# Altium footprint library _components.PcbLib: 53 footprints (part 1 of 4)
Each footprint in its own frame and in the unit in brackets; x right, y up, seen from the top. Pads: shape width x height; smd on the part's side, far side on the other; paste and mask are expansions set on the pad; w line width, h text height; cw(c..) or ccw(c..) is an arc to the next point about the centre after c.
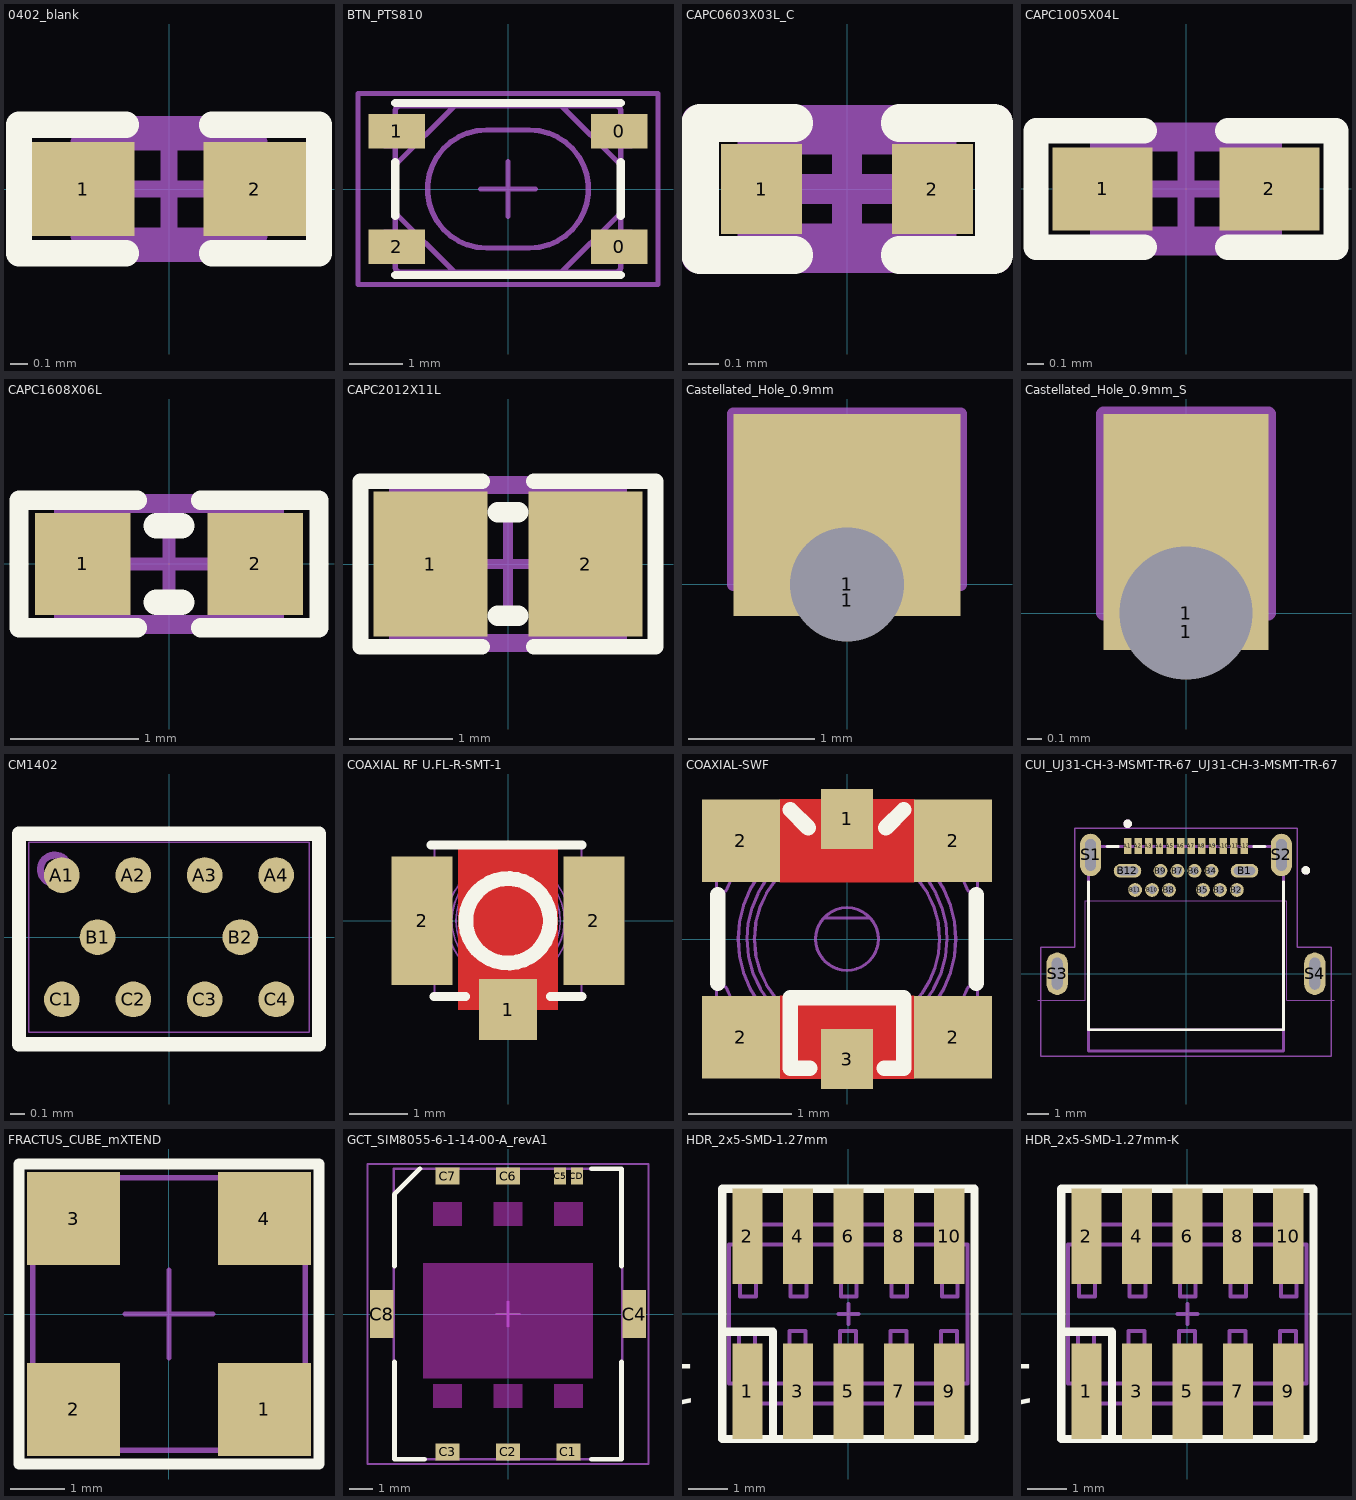
[diagram p0: the footprints below, top view; thin cyan lines are the x and y axes]

## 0402_blank [mm] "Blank footprint"
pads (2):
  rect 0.6x0.55 smd: 1(-0.5,0) 2(0.5,0)
Top Overlay:
  lines w0.152: -0.25,-0.375 -0.875,-0.375 -0.875,0.375 -0.25,0.375 ; 0.25,-0.375 0.875,-0.375 0.875,0.375 0.25,0.375
Top Assembly Info:
  lines w0.1: -0.525,-0.275 -0.525,0.275 0.525,0.275 0.525,-0.275 -0.525,-0.275
  text ".Designator" at -0.432,-0.152 h0.3
Top Placement:
  lines w0.1: -0.275,0 0.275,0 ; 0,-0.275 0,0.275 ; -0.875,-0.375 0.875,-0.375 0.875,0.375 -0.875,0.375 -0.875,-0.375

## BTN_PTS810 [mm]
height 2.5
pads (4):
  rect 1.05x0.65 smd: 0(2.075,-1.075) 0(2.075,1.075) 1(-2.075,1.075) 2(-2.075,-1.075)
Top Overlay:
  lines w0.15: -2.1,-1.6 2.1,-1.6 ; -2.1,-0.5 -2.1,0.5 ; -2.1,1.6 2.1,1.6 ; 2.1,-0.5 2.1,0.5
Top Assembly Info:
  lines w0.1: -2.1,-1.35 -2.3,-1.35 -2.3,-0.8 -2.1,-0.8 ; -2.1,-0.45 -1,-1.55 ; -2.1,0.45 -1,1.55 ; -2.1,0.8 -2.3,0.8 -2.3,1.35 -2.1,1.35 ; 1,-1.55 2.1,-0.45 ; 1,1.55 2.1,0.45 ; 2.1,-1.35 2.3,-1.35 2.3,-0.8 2.1,-0.8 ; 2.1,0.8 2.3,0.8 2.3,1.35 2.1,1.35 ; -2.1,-1.45 ccw(c-2,-1.45) -2,-1.55 2,-1.55 ccw(c2,-1.45) 2.1,-1.45 2.1,1.45 ccw(c2,1.45) 2,1.55 -2,1.55 ccw(c-2,1.45) -2.1,1.45 -2.1,-1.45 ; -0.4,-1.1 cw(c-0.4,0) -0.4,1.1 0.4,1.1 cw(c0.4,0) 0.4,-1.1 -0.4,-1.1
Top Placement:
  lines w0.1: -0.508,0 0.508,0 ; 0,-0.508 0,0.508 ; -2.794,-1.778 -2.794,1.778 -2.286,1.778 2.794,1.778 2.794,-1.778 -2.794,-1.778
3D body "Y97LT25BADBFP_-PTS810 SJ 250 SMTR.stp": height 2.5, standoff 0, extent -2.287,-1.6 2.288,1.6

## CAPC0603X03L_C [mm]
pads (2):
  rect 0.27x0.3 smd: 1(-0.285,0) 2(0.285,0)
Top Overlay:
  lines w0.125: -0.175,-0.22 -0.49,-0.22 -0.49,0.22 -0.175,0.22 ; 0.175,-0.22 0.49,-0.22 0.49,0.22 0.175,0.22
Top Assembly Info:
  lines w0.1: -0.315,-0.165 -0.315,0.165 0.315,0.165 0.315,-0.165 -0.315,-0.165
  text ".Designator" at -0.306,0.268 h0.3
Top Placement:
  lines w0.1: -0.165,0 0.165,0 ; 0,-0.165 0,0.165 ; -0.5,-0.23 -0.5,0.23 0.5,0.23 0.5,-0.23 -0.5,-0.23
3D body "User Library-0201(0603M) Cap.step": height 0.3, standoff -0.01, extent -0.305,-0.152 0.305,0.153

## CAPC1005X04L [mm]
pads (2):
  rect 0.6x0.5 smd: 1(-0.5,0) 2(0.5,0)
Top Overlay:
  lines w0.152: -0.25,-0.35 -0.9,-0.35 -0.9,0.35 -0.25,0.35 ; 0.25,-0.35 0.9,-0.35 0.9,0.35 0.25,0.35
Top Assembly Info:
  lines w0.1: -0.525,-0.275 0.525,-0.275 0.525,0.275 -0.525,0.275 -0.525,-0.275
  text ".Designator" at -0.432,-0.152 h0.3
Top Placement:
  lines w0.1: -0.275,0 0.275,0 ; 0,-0.275 0,0.275 ; -0.9,-0.35 -0.9,0.35 0.9,0.35 0.9,-0.35 -0.9,-0.35
3D body "User Library-0402(1005M) Cap.step": height 0.5, standoff -0.01, extent -0.508,-0.254 0.508,0.254

## CAPC1608X06L [mm]
pads (2):
  rect 0.75x0.8 smd: 1(-0.675,0) 2(0.675,0)
Top Overlay:
  lines w0.152: -0.25,-0.5 -1.175,-0.5 -1.175,0.5 -0.25,0.5 ; 0.25,-0.5 1.175,-0.5 1.175,0.5 0.25,0.5
  lines w0.2: -0.1,-0.3 0.1,-0.3 ; -0.1,0.3 0.1,0.3
Top Assembly Info:
  lines w0.1: -0.85,-0.45 -0.85,0.45 0.85,0.45 0.85,-0.45 -0.85,-0.45
  text ".Designator" at -0.685,-0.142 h0.38
Top Placement:
  lines w0.1: -0.45,0 0.45,0 ; 0,-0.45 0,0.45 ; -1.175,-0.5 1.175,-0.5 1.175,0.5 -1.175,0.5 -1.175,-0.5
3D body "User Library-Chip Capacitor 0603.step": height 0.8, standoff 0, extent -0.8,-0.43 0.8,0.43

## CAPC2012X11L [mm] "Chip Capacitor, 2-Leads, Body 2.0x1.3mm, IPC High Density"
height 1.1
pads (2):
  rect 1.1x1.4 smd: 1(-0.75,0) 2(0.75,0)
Top Overlay:
  lines w0.152: -0.25,-0.8 -1.425,-0.8 -1.425,0.8 -0.25,0.8 ; 0.25,-0.8 1.425,-0.8 1.425,0.8 0.25,0.8
  lines w0.2: -0.1,-0.5 0.1,-0.5 ; -0.1,0.5 0.1,0.5
Top Assembly Info:
  lines w0.1: -1.1,-0.725 -1.1,0.725 1.1,0.725 1.1,-0.725 -1.1,-0.725
  text ".Designator" at -0.675,-0.15 h0.38
Top Placement:
  lines w0.1: -0.5,0 0.5,0 ; 0,-0.5 0,0.5 ; -1.425,-0.8 -1.425,0.8 1.425,0.8 1.425,-0.8 -1.425,-0.8
3D body "SW3dPS-0805 SMD Capacitor.STEP": height 0.77, standoff -0.01, extent -1,-0.625 1,0.625

## Castellated_Hole_0.9mm [mm]
pads (2):
  rect 1.8x0.25 hole 0.25 square: 1(0,-0.126)
  rect 1.8x1.35 hole 0.9 copper offset 0,0.675: 1(0,0)
Top Assembly Info:
  lines w0.1: -0.9,0 -0.9,1.35 0.9,1.35 0.9,0 0.45,0 ccw(c0,0) -0.45,0 -0.9,0
Mechanical 8:
  lines w0.1: -0.9,0 -0.45,0 cw(c0,0) 0.45,0 0.9,0 0.9,1.35 -0.9,1.35 -0.9,0

## Castellated_Hole_0.9mm_S [mm]
height 9.5
pads (2):
  rect 1.118x0.25 hole 0.25 square: 1(0,-0.126)
  rect 1.118x1.35 hole 0.9 copper offset 0,0.675: 1(0,0)
Top Assembly Info:
  lines w0.1: -0.559,0 -0.559,1.35 0.559,1.35 0.559,0 0.45,0 ccw(c0,0) -0.45,0 -0.559,0
Mechanical 8:
  lines w0.1: -0.559,0 -0.45,0 cw(c0,0) 0.45,0 0.559,0 0.559,1.35 -0.559,1.35 -0.559,0

## CM1402 [mm]
pads (10):
  round 0.25 smd mask+0.05: A1(-0.75,0.435) A2(-0.25,0.435) A3(0.25,0.435) A4(0.75,0.435) B1(-0.5,0) B2(0.5,0) C1(-0.75,-0.435) C2(-0.25,-0.435) C3(0.25,-0.435) C4(0.75,-0.435)
Top Overlay:
  lines w0.1: -1.05,-0.75 -1.05,0.725 1.05,0.725 1.05,-0.75 -1.05,-0.75
  text "." at -0.8,1 h0.3
Top Assembly Info:
  lines w0.01: -0.98,-0.665 -0.98,0.665 0.98,0.665 0.98,-0.665 -0.98,-0.665
  text ".Designator" at -0.375,-0.05 h0.15
Top Placement:
  circle w0.05: c-0.8,0.475 r0.1
  lines w0.01: -0.98,-0.665 0.98,-0.665 0.98,0.665 -0.98,0.665 -0.98,-0.665
3D body: height 0.72, standoff 0.21, extent -0.98,-0.665 0.98,0.665

## COAXIAL RF U.FL-R-SMT-1 [mm]
pads (3):
  rect 1x1.05 smd: 1(0,-1.525)
  rect 1.05x2.2 smd: 2(-1.475,0) 2(1.475,0)
Top Layer:
  pour cut-out: 0.85,1.3 -0.85,1.3 -0.85,-1.525 0.85,-1.525
Top Overlay:
  circle w0.254: c0,0 r0.725
  lines w0: 0.725,1.3 1.275,1.3
  lines w0.152: -1.325,1.3 1.275,1.3 ; -1.275,-1.3 -0.725,-1.3 ; 0.725,-1.3 1.275,-1.3
Top Assembly Info:
  drawing of 206 lines, arcs and shapes, not listed
  text ".Designator" at -0.375,-0.125 h0.38
3D body "U.FL-R-SMT-1.stp": height 1.25, standoff 0, extent -1.5,-1.6 1.5,1.5

## COAXIAL-SWF [mm]
pads (6):
  rect 0.5x0.58 smd: 1(0,1.16) 3(0,-1.16)
  rect 0.75x0.8 smd: 2(-1.025,-0.95) 2(-1.025,0.95) 2(1.025,-0.95) 2(1.025,0.95)
Top Layer:
  pour cut-out: -0.65,0.55 0.65,0.55 0.65,1.35 -0.65,1.35
  pour cut-out: 0.65,-0.55 -0.65,-0.55 -0.65,-1.35 0.65,-1.35
Top Overlay:
  lines w0.15: -1.25,-0.43 -1.25,0.43 ; -0.55,1.25 -0.375,1.075 ; -0.36,-1.25 -0.55,-1.25 -0.55,-0.57 0.55,-0.57 0.55,-1.25 0.36,-1.25 ; 0.375,1.075 0.55,1.25 ; 1.25,-0.43 1.25,0.43
Top Assembly Info:
  drawing of 206 lines, arcs and shapes, not listed
  text ".Designator" at -0.785,-0.7 h0.38
3D body: height 0.15, standoff 0, extent -0.227,-1.301 0.227,-0.758
3D body: height 0.15, standoff 0, extent -0.227,0.899 0.227,1.299
3D body: height 0.6, standoff 0.55, extent -1.262,-1.248 1.262,1.251
3D body: height 1.4, standoff 0.6, extent -0.9,-0.9 0.9,0.901
3D body: height 0.75, standoff 0.6, extent -1.05,-1.049 1.05,1.05
3D body: height 0.95, standoff 0.75, extent -1,-0.999 1,1.001
3D body: height 0.6, standoff 0, extent 0.757,0.655 1.262,1.249
3D body: height 0.6, standoff 0, extent 0.757,-1.246 1.262,-0.653
3D body: height 0.6, standoff 0, extent -1.262,-1.25 -0.757,-0.649
3D body: height 0.6, standoff 0, extent -1.262,0.655 -0.757,1.248
3D body: height 0.55, standoff 0.1, extent -1.262,-1.252 1.262,1.253
3D body: height 0.9, standoff 0.6, extent -1.05,-1.049 1.05,1.05
3D body: height 1.25, standoff 0.95, extent -1.05,-1.049 1.05,1.05
3D body: height 1.55, standoff 1.25, extent -1.05,-1.05 1.05,1.05

## CUI_UJ31-CH-3-MSMT-TR-67_UJ31-CH-3-MSMT-TR-67 [mm] "USB-C receptable, in-board"
pads (28):
  rect 0.35x0.75 smd: A1(-2.75,6.025) A2(-2.25,6.025) A3(-1.75,6.025) A4(-1.25,6.025) A5(-0.75,6.025) A6(-0.25,6.025) A7(0.25,6.025) A8(0.75,6.025) A9(1.25,6.025) A10(1.75,6.025) A11(2.25,6.025) A12(2.75,6.025)
  oval 1.3x0.65 hole 0.4 slot 1 at 0 deg: B1(2.76,4.85) B12(-2.76,4.85)
  round 0.65 hole 0.4: B2(2.4,3.95) B3(1.6,3.95) B4(1.2,4.85) B5(0.8,3.95) B6(0.4,4.85) B7(-0.4,4.85) B8(-0.8,3.95) B9(-1.2,4.85) B10(-1.6,3.95) B11(-2.4,3.95)
  oval 1x2 hole 0.5 slot 1.5 at 90 deg: S1(-4.5,5.6) S2(4.5,5.6) S3(-6.075,0) S4(6.075,0)
Top Overlay:
  circle w0.2: c5.65,4.87 r0.1
  circle w0.2: c-2.75,7.07 r0.1
  lines w0.127: -4.6,4.33 -4.6,-2.65 4.6,-2.65 4.6,4.33 ; -3.73,6 -3.2,6 ; 3.2,6 3.73,6
Board Outline:
  lines w0: -7,-1.25 -4.75,-1.25 -4.75,3.45 4.75,3.45 4.75,-1.25 7,-1.25 ; -6.325,-0.5 ccw(c-6.075,-0.5) -5.825,-0.5 -5.825,0.5 ccw(c-6.075,0.5) -6.325,0.5 -6.325,-0.5 ; -4.75,5.3 ccw(c-4.5,5.3) -4.25,5.3 -4.25,5.9 ccw(c-4.5,5.9) -4.75,5.9 -4.75,5.3 ; -3.1,4.65 cw(c-3.1,4.85) -3.1,5.05 -2.42,5.05 cw(c-2.42,4.85) -2.42,4.65 -3.1,4.65 ; 2.42,4.65 cw(c2.42,4.85) 2.42,5.05 3.1,5.05 cw(c3.1,4.85) 3.1,4.65 2.42,4.65 ; 4.25,5.3 ccw(c4.5,5.3) 4.75,5.3 4.75,5.9 ccw(c4.5,5.9) 4.25,5.9 4.25,5.3 ; 5.825,-0.5 ccw(c6.075,-0.5) 6.325,-0.5 6.325,0.5 ccw(c6.075,0.5) 5.825,0.5 5.825,-0.5
Top Component Info:
  circle w0.2: c5.65,4.87 r0.1
  circle w0.2: c-2.75,7.07 r0.1
  circle w0.2: c-2.75,7.07 r0.1
  circle w0.2: c5.65,4.87 r0.1
  lines w0.127: -4.6,-3.65 4.6,-3.65 ; -4.6,-3.65 -4.6,-2.65 ; -4.6,-3.65 -4.6,-2.65 ; -4.6,-3.65 4.6,-3.65 ; -4.6,-2.65 4.6,-2.65 ; -4.6,-2.65 -4.6,6 ; -4.6,-2.65 -4.6,6 ; -4.6,-2.65 4.6,-2.65 ; -4.6,6 4.6,6 ; -4.6,6 4.6,6 ; 4.6,-3.65 4.6,-2.65 ; 4.6,-3.65 4.6,-2.65 ; 4.6,-2.65 4.6,6 ; 4.6,-2.65 4.6,6
Top Assembly Info:
  lines w0.076: -6.85,-3.9 6.85,-3.9 6.85,1.25 5.25,1.25 5.25,6.85 -5.25,6.85 -5.25,1.25 -6.85,1.25 -6.85,-3.9
3D body "CUI_UJ31-CH-3-MSMT-TR-67.step": height 2.39, standoff -1.63, extent -6.175,-3.643 6.175,6.293

## FRACTUS_CUBE_mXTEND [mm]
height 5
pads (4):
  rect 1.7x1.7 smd: 1(1.75,-1.75) 2(-1.75,-1.75) 3(-1.75,1.75) 4(1.75,1.75)
Top Overlay:
  lines w0.2: -2.75,-2.75 2.75,-2.75 2.75,2.75 -2.75,2.75 -2.75,-2.75
Top Assembly Info:
  lines w0.1: -2.5,-2.5 -2.5,2.5 2.5,2.5 2.5,-2.5 -2.5,-2.5
  text ".Designator" at -0.6,-0.1 h0.3
Top Placement:
  lines w0.1: -0.8,0 0.8,0 ; 0,-0.8 0,0.8 ; -2.75,-2.75 -2.75,2.75 2.75,2.75 2.75,-2.75 -2.75,-2.75
3D body: height 2.1, standoff 0, extent 3.45,1.8 3.45,1.8
3D body: height 2.1, standoff 0, extent 3.2,0.8 3.2,0.8
3D body: height 2.1, standoff 0, extent 3.2,1.55 3.2,1.55
3D body "FR01-S4-250 NN.stp": height 5.01, standoff 0, extent -2.5,-2.5 2.5,2.5

## GCT_SIM8055-6-1-14-00-A_revA1 [mm] "Nano SIM Card Connector, Push-Pull Type, 6 Pin, SMT, Profile 1.35mm"
height 1.35
pads (9):
  rect 1x0.7 smd: C1(2.54,-5.795) C2(0,-5.795) C3(-2.54,-5.795) C6(0,5.795) C7(-2.54,5.795)
  rect 1x2 smd: C4(5.3,0) C8(-5.3,0)
  rect 0.5x0.7 smd: C5(2.19,5.795) CD(2.89,5.795)
Top Layer keep-out:
  rectangle: -3.575,-2.7 3.575,2.15
  rectangle: 1.94,3.7 3.14,4.7
  rectangle: -0.6,3.7 0.6,4.7
  rectangle: -3.14,3.7 -1.94,4.7
  rectangle: -3.14,-3.95 -1.94,-2.95
  rectangle: -0.6,-3.95 0.6,-2.95
  rectangle: 1.94,-3.95 3.14,-2.95
Top Overlay:
  lines w0.2: -4.77,-2.02 -4.77,-6.1 -3.5,-6.1 ; -4.77,2.02 -4.77,5.03 -3.7,6.1 ; 3.5,-6.1 4.77,-6.1 4.77,-2.02 ; 3.5,6.1 4.77,6.1 4.77,2.02
Top Assembly Info:
  lines w0.1: -4.8,-6.1 -4.8,6.1 4.8,6.1 4.8,-6.1 -4.8,-6.1
  text ".Designator" at -0.3,-0.1 h0.3
Top Placement:
  lines w0.1: -0.5,0 0.5,0 ; -5.9,-6.3 -5.9,6.3 5.9,6.3 5.9,-6.3 -5.9,-6.3
  lines w0.127: 0,-0.5 0,0.5
3D body "SIM8055-6-1-14-00-A_revA1.STEP": height 1.35, standoff 0, extent -5.466,-6.096 5.334,6.104

## HDR_2x5-SMD-1.27mm [mm]
pads (10):
  rect 0.76x2.4 smd: 1(-2.54,-1.95) 2(-2.54,1.95) 3(-1.27,-1.95) 4(-1.27,1.95) 5(0,-1.95) 6(0,1.95) 7(1.27,-1.95) 8(1.27,1.95) 9(2.54,-1.95) 10(2.54,1.95)
Top Overlay:
  lines w0.203: -3.175,-0.45 -1.9,-0.45 -1.9,-3.15 ; -3.175,-3.15 -3.175,3.15 3.175,3.15 3.175,-3.15 -3.175,-3.15
  text "1" at -3.81,-1.27 h1.02
Top Assembly Info:
  lines w0.1: -2.74,-1.75 -2.74,-2.459 ccw(c-2.54,-2.459) -2.34,-2.459 -2.34,-2.25 ; -2.74,1.75 -2.74,2.459 cw(c-2.54,2.459) -2.34,2.459 -2.34,2.25 ; -2.5,-1.75 -2.5,-2.25 -1.25,-2.25 ; -2.5,1.75 -2.5,2.25 2.5,2.25 2.5,1.75 ; -1.47,-2.25 -1.47,-2.459 ccw(c-1.27,-2.459) -1.07,-2.459 -1.07,-2.25 ; -1.47,2.25 -1.47,2.459 cw(c-1.27,2.459) -1.07,2.459 -1.07,2.25 ; -1.25,-1.75 -1.25,-2.25 ; -0.2,-2.25 -0.2,-2.459 ccw(c0,-2.459) 0.2,-2.459 0.2,-2.25 ; -0.2,2.25 -0.2,2.459 cw(c0,2.459) 0.2,2.459 0.2,2.25 ; 1.07,-2.25 1.07,-2.459 ccw(c1.27,-2.459) 1.47,-2.459 1.47,-2.25 ; 1.07,2.25 1.07,2.459 cw(c1.27,2.459) 1.47,2.459 1.47,2.25 ; 1.25,-1.75 1.25,-2.25 ; 2.34,-2.25 2.34,-2.459 ccw(c2.54,-2.459) 2.74,-2.459 2.74,-1.75 ; 2.34,2.25 2.34,2.459 cw(c2.54,2.459) 2.74,2.459 2.74,1.75 ; 2.5,-1.75 2.5,-2.25 1.25,-2.25 ; -1.25,-2.25 1.25,-2.25 ; -3,-1.75 -3,1.75 3,1.75 3,-1.75 -3,-1.75 ; -2.75,-0.835 -2.75,-0.435 -2.35,-0.435 -2.35,-0.835 -2.75,-0.835 ; -2.73,0.435 -2.73,0.835 -2.33,0.835 -2.33,0.435 -2.73,0.435 ; -1.48,-0.835 -1.48,-0.435 -1.08,-0.435 -1.08,-0.835 -1.48,-0.835 ; -1.46,0.435 -1.46,0.835 -1.06,0.835 -1.06,0.435 -1.46,0.435 ; -0.21,-0.835 -0.21,-0.435 0.19,-0.435 0.19,-0.835 -0.21,-0.835 ; -0.19,0.435 -0.19,0.835 0.21,0.835 0.21,0.435 -0.19,0.435 ; 1.06,-0.835 1.06,-0.435 1.46,-0.435 1.46,-0.835 1.06,-0.835 ; 1.08,0.435 1.08,0.835 1.48,0.835 1.48,0.435 1.08,0.435 ; 2.33,-0.835 2.33,-0.435 2.73,-0.435 2.73,-0.835 2.33,-0.835 ; 2.35,0.435 2.35,0.835 2.75,0.835 2.75,0.435 2.35,0.435
  text ".Designator" at 0.356,0.152 h0.3
Top Placement:
  lines w0.1: -0.254,0 0.254,0 ; 0,-0.254 0,0.254 ; -3.175,-3.156 3.175,-3.156 3.175,3.144 -3.175,3.144 -3.175,-3.156

## HDR_2x5-SMD-1.27mm-K [mm]
pads (10):
  rect 0.76x2.4 smd: 1(-2.54,-1.95) 2(-2.54,1.95) 3(-1.27,-1.95) 4(-1.27,1.95) 5(0,-1.95) 6(0,1.95) 7(1.27,-1.95) 8(1.27,1.95) 9(2.54,-1.95) 10(2.54,1.95)
Top Overlay:
  lines w0.203: -3.175,-0.45 -1.9,-0.45 -1.9,-3.15 ; -3.175,-3.15 -3.175,3.15 3.175,3.15 3.175,-3.15 -3.175,-3.15
  text "1" at -3.81,-1.27 h1.02
Top Assembly Info:
  lines w0.1: -2.74,-1.75 -2.74,-2.459 ccw(c-2.54,-2.459) -2.34,-2.459 -2.34,-2.25 ; -2.74,1.75 -2.74,2.459 cw(c-2.54,2.459) -2.34,2.459 -2.34,2.25 ; -2.5,-1.75 -2.5,-2.25 -1.25,-2.25 ; -2.5,1.75 -2.5,2.25 2.5,2.25 2.5,1.75 ; -1.47,-2.25 -1.47,-2.459 ccw(c-1.27,-2.459) -1.07,-2.459 -1.07,-2.25 ; -1.47,2.25 -1.47,2.459 cw(c-1.27,2.459) -1.07,2.459 -1.07,2.25 ; -1.25,-1.75 -1.25,-2.25 ; -0.2,-2.25 -0.2,-2.459 ccw(c0,-2.459) 0.2,-2.459 0.2,-2.25 ; -0.2,2.25 -0.2,2.459 cw(c0,2.459) 0.2,2.459 0.2,2.25 ; 1.07,-2.25 1.07,-2.459 ccw(c1.27,-2.459) 1.47,-2.459 1.47,-2.25 ; 1.07,2.25 1.07,2.459 cw(c1.27,2.459) 1.47,2.459 1.47,2.25 ; 1.25,-1.75 1.25,-2.25 ; 2.34,-2.25 2.34,-2.459 ccw(c2.54,-2.459) 2.74,-2.459 2.74,-1.75 ; 2.34,2.25 2.34,2.459 cw(c2.54,2.459) 2.74,2.459 2.74,1.75 ; 2.5,-1.75 2.5,-2.25 1.25,-2.25 ; -1.25,-2.25 1.25,-2.25 ; -3,-1.75 -3,1.75 3,1.75 3,-1.75 -3,-1.75 ; -2.75,-0.835 -2.75,-0.435 -2.35,-0.435 -2.35,-0.835 -2.75,-0.835 ; -2.73,0.435 -2.73,0.835 -2.33,0.835 -2.33,0.435 -2.73,0.435 ; -1.48,-0.835 -1.48,-0.435 -1.08,-0.435 -1.08,-0.835 -1.48,-0.835 ; -1.46,0.435 -1.46,0.835 -1.06,0.835 -1.06,0.435 -1.46,0.435 ; -0.21,-0.835 -0.21,-0.435 0.19,-0.435 0.19,-0.835 -0.21,-0.835 ; -0.19,0.435 -0.19,0.835 0.21,0.835 0.21,0.435 -0.19,0.435 ; 1.06,-0.835 1.06,-0.435 1.46,-0.435 1.46,-0.835 1.06,-0.835 ; 1.08,0.435 1.08,0.835 1.48,0.835 1.48,0.435 1.08,0.435 ; 2.33,-0.835 2.33,-0.435 2.73,-0.435 2.73,-0.835 2.33,-0.835 ; 2.35,0.435 2.35,0.835 2.75,0.835 2.75,0.435 2.35,0.435
  text ".Designator" at 0.356,0.152 h0.3
Top Placement:
  lines w0.1: -0.254,0 0.254,0 ; 0,-0.254 0,0.254 ; -3.175,-3.156 3.175,-3.156 3.175,3.144 -3.175,3.144 -3.175,-3.156
3D body "Samtec-FTSH-105-01-F-DV-K.step": height 6.11, standoff -0.01, extent -3.137,-2.921 3.137,2.921